# Altium footprint library LukaLIBRARY.PcbLib: 784 footprints (part 40 of 49)
Each footprint in its own frame and in the unit in brackets; x right, y up, seen from the top. Pads: shape width x height; smd on the part's side, far side on the other; paste and mask are expansions set on the pad; w line width, h text height; cw(c..) or ccw(c..) is an arc to the next point about the centre after c.
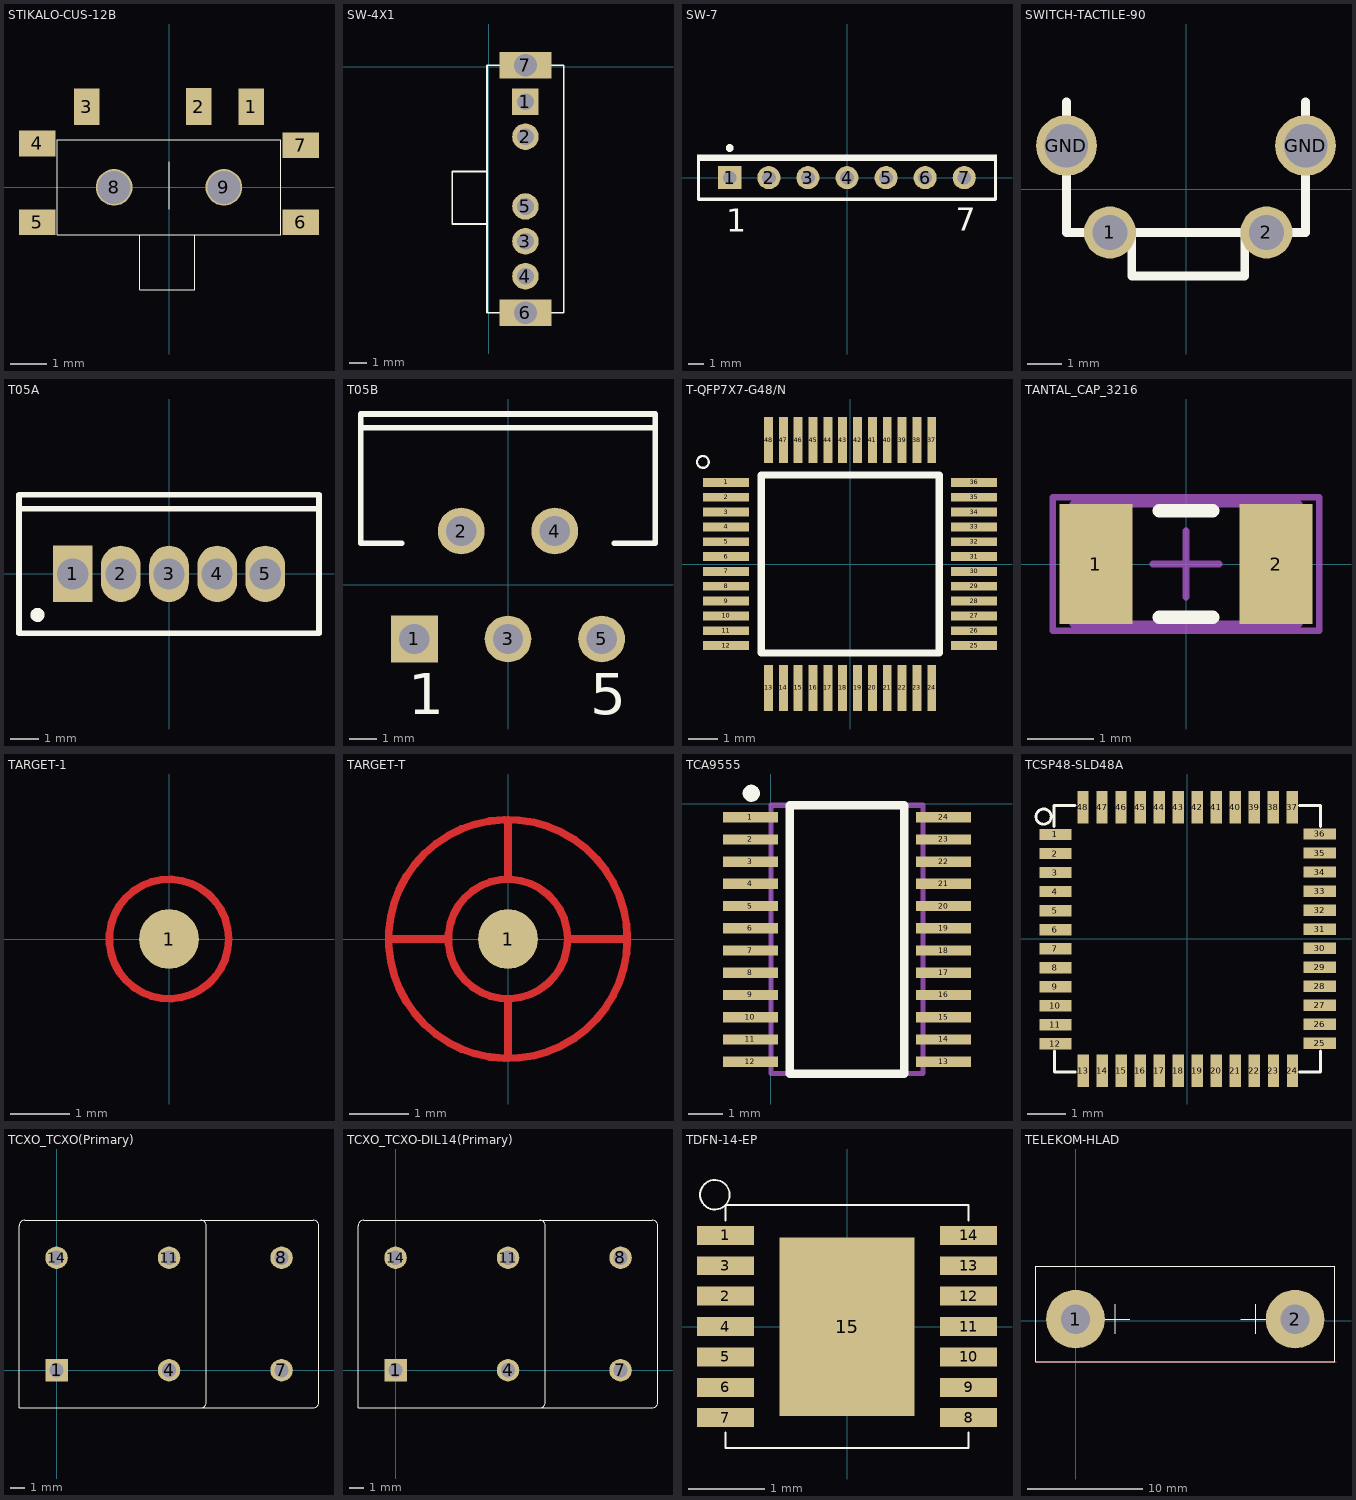
[diagram p39: the footprints below, top view; thin cyan lines are the x and y axes]

## STIKALO-CUS-12B [mm]
pads (9):
  rect 0.7x1 smd: 1(2.25,2.2) 2(0.813,2.21) 3(-2.25,2.2)
  rect 1x0.7 smd: 4(-3.6,1.2) 5(-3.6,-0.95) 6(3.6,-0.95) 7(3.6,1.15)
  round 1 hole 0.9 unplated: 8(-1.5,0) 9(1.5,0)
Top Overlay:
  lines w0.03: -0.15,-1.3 3.05,-1.3 3.05,1.3 -3.05,1.3 -3.05,-1.3 0,-1.3 ; 0,-0.6 0,0.7 ; -0.8,-2.8 0.7,-2.8 0.7,-1.3 -0.8,-1.3 -0.8,-2.8

## SW-4X1 [mm]
pads (7):
  rect 1.524x1.524 hole 0.965 mask-25.4: 1(2.1,-2)
  round 1.524 hole 0.965 mask-25.4: 2(2.1,-4) 3(2.1,-10) 4(2.1,-12) 5(2.1,-8)
  rect 3x1.524 hole 1.3 mask-25.4: 6(2.1,-14.1) 7(2.1,0.1)
Top Overlay:
  lines w0.1: -0.1,-9 -2.1,-9 -2.1,-6 -0.1,-6 ; 1.3,-14.1 -0.1,-14.1 -0.1,0.1 1.3,0.1 ; 2.9,-14.1 4.3,-14.1 4.3,0.1 2.9,0.1
Top Solder:
  region: 2.1,-9.231 1.901,-9.258 1.716,-9.334 1.557,-9.457 1.434,-9.616 1.358,-9.801 1.331,-10 1.358,-10.199 1.434,-10.384 1.557,-10.543 1.716,-10.666 1.901,-10.742 2.1,-10.769 2.299,-10.742 2.484,-10.666 2.643,-10.543 2.766,-10.384 2.842,-10.199 2.869,-10 2.842,-9.801 2.766,-9.616 2.643,-9.457 2.484,-9.334 2.299,-9.258
  region: 2.1,-11.231 1.901,-11.258 1.716,-11.334 1.557,-11.457 1.434,-11.616 1.358,-11.801 1.331,-12 1.358,-12.199 1.434,-12.384 1.557,-12.543 1.716,-12.666 1.901,-12.742 2.1,-12.769 2.299,-12.742 2.484,-12.666 2.643,-12.543 2.766,-12.384 2.842,-12.199 2.869,-12 2.842,-11.801 2.766,-11.616 2.643,-11.457 2.484,-11.334 2.299,-11.258
  region: 2.1,-7.231 1.901,-7.258 1.716,-7.334 1.557,-7.457 1.434,-7.616 1.358,-7.801 1.331,-8 1.358,-8.199 1.434,-8.384 1.557,-8.543 1.716,-8.666 1.901,-8.742 2.1,-8.769 2.299,-8.742 2.484,-8.666 2.643,-8.543 2.766,-8.384 2.842,-8.199 2.869,-8 2.842,-7.801 2.766,-7.616 2.643,-7.457 2.484,-7.334 2.299,-7.258
  region: 2.1,-3.231 1.901,-3.258 1.716,-3.334 1.557,-3.457 1.434,-3.616 1.358,-3.801 1.331,-4 1.358,-4.199 1.434,-4.384 1.557,-4.543 1.716,-4.666 1.901,-4.742 2.1,-4.769 2.299,-4.742 2.484,-4.666 2.643,-4.543 2.766,-4.384 2.842,-4.199 2.869,-4 2.842,-3.801 2.766,-3.616 2.643,-3.457 2.484,-3.334 2.299,-3.258
  region: 1.338,-2.762 2.862,-2.762 2.862,-1.238 1.338,-1.238
  region: 3.6,-0.662 3.6,0.862 0.6,0.862 0.6,-0.662
  region: 3.6,-14.862 3.6,-13.338 0.6,-13.338 0.6,-14.862
Bottom Solder:
  region: 2.1,-9.231 1.901,-9.258 1.716,-9.334 1.557,-9.457 1.434,-9.616 1.358,-9.801 1.331,-10 1.358,-10.199 1.434,-10.384 1.557,-10.543 1.716,-10.666 1.901,-10.742 2.1,-10.769 2.299,-10.742 2.484,-10.666 2.643,-10.543 2.766,-10.384 2.842,-10.199 2.869,-10 2.842,-9.801 2.766,-9.616 2.643,-9.457 2.484,-9.334 2.299,-9.258
  region: 2.1,-11.231 1.901,-11.258 1.716,-11.334 1.557,-11.457 1.434,-11.616 1.358,-11.801 1.331,-12 1.358,-12.199 1.434,-12.384 1.557,-12.543 1.716,-12.666 1.901,-12.742 2.1,-12.769 2.299,-12.742 2.484,-12.666 2.643,-12.543 2.766,-12.384 2.842,-12.199 2.869,-12 2.842,-11.801 2.766,-11.616 2.643,-11.457 2.484,-11.334 2.299,-11.258
  region: 2.1,-7.231 1.901,-7.258 1.716,-7.334 1.557,-7.457 1.434,-7.616 1.358,-7.801 1.331,-8 1.358,-8.199 1.434,-8.384 1.557,-8.543 1.716,-8.666 1.901,-8.742 2.1,-8.769 2.299,-8.742 2.484,-8.666 2.643,-8.543 2.766,-8.384 2.842,-8.199 2.869,-8 2.842,-7.801 2.766,-7.616 2.643,-7.457 2.484,-7.334 2.299,-7.258
  region: 2.1,-3.231 1.901,-3.258 1.716,-3.334 1.557,-3.457 1.434,-3.616 1.358,-3.801 1.331,-4 1.358,-4.199 1.434,-4.384 1.557,-4.543 1.716,-4.666 1.901,-4.742 2.1,-4.769 2.299,-4.742 2.484,-4.666 2.643,-4.543 2.766,-4.384 2.842,-4.199 2.869,-4 2.842,-3.801 2.766,-3.616 2.643,-3.457 2.484,-3.334 2.299,-3.258
  region: 1.338,-2.762 2.862,-2.762 2.862,-1.238 1.338,-1.238
  region: 3.6,-0.662 3.6,0.862 0.6,0.862 0.6,-0.662
  region: 3.6,-14.862 3.6,-13.338 0.6,-13.338 0.6,-14.862

## SW-7 [mm] "Switch; 7 Leads"
pads (7):
  rect 1.5x1.5 hole 0.9: 1(-7.62,0)
  round 1.5 hole 0.9: 2(-5.08,0) 3(-2.54,0) 4(0,0) 5(2.54,0) 6(5.08,0) 7(7.62,0)
Top Overlay:
  circle w0.25: c-7.625,1.929 r0.125
  rectangle: -9.75,1.1 9.75,1.5
  lines w0.2: -9.65,1.4 -9.65,-1.4 9.65,-1.4 9.65,1.4
  text "7" at 7.084,-3.445 h1.5
  text "1" at -7.851,-3.526 h1.5

## SWITCH-TACTILE-90 [mil]
pads (4):
  round 60 hole 40: 1(-87.5,-50) 2(92.5,-50)
  round 70 hole 50: GND(-137.5,50) GND(137.5,50)
Top Overlay:
  lines w10: -137.5,100 -137.5,-50 137.5,-50 137.5,100 ; -62.5,-50 -62.5,-100 67.5,-100 67.5,-50

## T05A [mm] "TO, Thru-Hole, Vertical, Heatsink Mounted; 5 In-Line Leads; Pitch 1.70 mm"
height 15.9
pads (5):
  rect 1.4x2 hole 1.1: 1(-3.4,0)
  oval 1.4x2 hole 1.1: 2(-1.7,0) 3(0,0) 4(1.7,0) 5(3.4,0)
Top Overlay:
  circle w0.25: c-4.65,-1.45 r0.125
  lines w0.2: -5.3,2.3 5.3,2.3 ; -5.3,-2.1 -5.3,2.8 5.3,2.8 5.3,-2.1 -5.3,-2.1
Mechanical 13:
  lines w0.1: -5.3,2.3 5.3,2.3 ; -5.3,-2.1 5.3,-2.1 5.3,2.8 -5.3,2.8 -5.3,-2.1 ; -3.91,-0.28 -2.89,-0.28 -2.89,0.28 -3.91,0.28 -3.91,-0.28 ; -2.21,-0.28 -1.19,-0.28 -1.19,0.28 -2.21,0.28 -2.21,-0.28 ; -0.51,-0.28 0.51,-0.28 0.51,0.28 -0.51,0.28 -0.51,-0.28 ; 1.19,-0.28 2.21,-0.28 2.21,0.28 1.19,0.28 1.19,-0.28 ; 2.89,-0.28 3.91,-0.28 3.91,0.28 2.89,0.28 2.89,-0.28
Mechanical 15:
  lines w0.1: -0.5,0 0.5,0 ; 0,-0.5 0,0.5
3D body: height 4.1, standoff 0, extent -3.909,-0.279 -2.891,0.279
3D body: height 4.1, standoff 0, extent -2.209,-0.279 -1.191,0.279
3D body: height 4.1, standoff 0, extent 1.191,-0.279 2.209,0.279
3D body: height 4.1, standoff 0, extent 2.891,-0.279 3.909,0.279
3D body: height 4.1, standoff 0, extent -0.509,-0.279 0.509,0.279
3D body: height 15.9, standoff 13, extent -5.299,2.301 5.299,2.799
3D body: height 13, standoff 4.1, extent -5.35,-2.15 5.35,2.85

## T05B [mm] "TO, Thru-Hole, Vertical, Heatsink Mounted; 5 Bent Staggered Leads; Pitch 1.7 mm"
height 21.1
pads (5):
  rect 1.7x1.7 hole 1.1: 1(-3.4,-1.96)
  round 1.7 hole 1.1: 2(-1.7,1.96) 3(0,-1.96) 4(1.7,1.96) 5(3.4,-1.96)
Top Overlay:
  lines w0.2: -5.35,5.71 5.35,5.71 ; -3.854,1.51 -5.35,1.51 -5.35,6.21 5.35,6.21 5.35,1.51 3.854,1.51
  text "5" at 2.98,-4.685 h1.5
  text "1" at -3.62,-4.685 h1.5

## T-QFP7X7-G48/N [mm]
pads (48):
  rect 1.55x0.3 smd: 1(-4.175,2.75) 2(-4.175,2.25) 3(-4.175,1.75) 4(-4.175,1.25) 5(-4.175,0.75) 6(-4.175,0.25) 7(-4.175,-0.25) 8(-4.175,-0.75) 9(-4.175,-1.25) 10(-4.175,-1.75) 11(-4.175,-2.25) 12(-4.175,-2.75) 25(4.175,-2.75) 26(4.175,-2.25) 27(4.175,-1.75) 28(4.175,-1.25) 29(4.175,-0.75) 30(4.175,-0.25) 31(4.175,0.25) 32(4.175,0.75) 33(4.175,1.25) 34(4.175,1.75) 35(4.175,2.25) 36(4.175,2.75)
  rect 0.3x1.55 smd: 13(-2.75,-4.175) 14(-2.25,-4.175) 15(-1.75,-4.175) 16(-1.25,-4.175) 17(-0.75,-4.175) 18(-0.25,-4.175) 19(0.25,-4.175) 20(0.75,-4.175) 21(1.25,-4.175) 22(1.75,-4.175) 23(2.25,-4.175) 24(2.75,-4.175) 37(2.75,4.175) 38(2.25,4.175) 39(1.75,4.175) 40(1.25,4.175) 41(0.75,4.175) 42(0.25,4.175) 43(-0.25,4.175) 44(-0.75,4.175) 45(-1.25,4.175) 46(-1.75,4.175) 47(-2.25,4.175) 48(-2.75,4.175)
Top Overlay:
  circle w0.076: c-4.96,3.44 r0.2
  lines w0.25: -3,-3 -3,3 3,3 3,-3 -3,-3

## TANTAL_CAP_3216 [mm] "Tantal Capacitor, Body 3.2x1.6mm, IPC High Density"
height 1.6
pads (2):
  rect 1.1x1.8 smd: 1(-1.35,0) 2(1.35,0)
Top Overlay:
  lines w0.2: -0.4,-0.8 0.4,-0.8 ; -0.4,0.8 0.4,0.8
Mechanical 13:
  lines w0.1: -1.7,-0.9 -1.7,0.9 1.7,0.9 1.7,-0.9 -1.7,-0.9
Mechanical 15:
  lines w0.1: -0.5,0 0.5,0 ; 0,-0.5 0,0.5 ; -2,-1 -2,1 2,1 2,-1 -2,-1
3D body: height 0.55, standoff 0, extent -1.7,-0.9 1.7,0.9

## TARGET-1 [mm]
pads (1):
  round 1 smd mask-25.4: 1(0,0)
Top Layer:
  circle w0.127: c0,0 r1
Top Solder:
  region: 0,2.512 -0.49,2.464 -0.961,2.321 -1.396,2.089 -1.776,1.776 -2.089,1.396 -2.321,0.961 -2.464,0.49 -2.512,0 -2.464,-0.49 -2.321,-0.961 -2.089,-1.396 -1.776,-1.776 -1.396,-2.089 -0.961,-2.321 -0.49,-2.464 0,-2.512 0.49,-2.464 0.961,-2.321 1.396,-2.089 1.776,-1.776 2.089,-1.396 2.321,-0.961 2.464,-0.49 2.512,0 2.464,0.49 2.321,0.961 2.089,1.396 1.776,1.776 1.396,2.089 0.961,2.321 0.49,2.464

## TARGET-T [mm]
pads (1):
  round 1 smd mask-25.4: 1(0,0)
Top Layer:
  circle w0.127: c0,0 r1
  circle w0.127: c0,0 r2
  lines w0.127: -2,0 -1,0 ; 0,-2 0,-1 ; 0,1 0,2 ; 1,0 2,0
Top Solder:
  region: 0,2.512 -0.49,2.464 -0.961,2.321 -1.396,2.089 -1.776,1.776 -2.089,1.396 -2.321,0.961 -2.464,0.49 -2.512,0 -2.464,-0.49 -2.321,-0.961 -2.089,-1.396 -1.776,-1.776 -1.396,-2.089 -0.961,-2.321 -0.49,-2.464 0,-2.512 0.49,-2.464 0.961,-2.321 1.396,-2.089 1.776,-1.776 2.089,-1.396 2.321,-0.961 2.464,-0.49 2.512,0 2.464,0.49 2.321,0.961 2.089,1.396 1.776,1.776 1.396,2.089 0.961,2.321 0.49,2.464

## TCA9555 [mm] "I2C I/O Ports PW Package"
pads (24):
  rect 1.6x0.3 smd: 1(-0.6,-0.4) 2(-0.6,-1.05) 3(-0.6,-1.7) 4(-0.6,-2.35) 5(-0.6,-3) 6(-0.6,-3.65) 7(-0.6,-4.3) 8(-0.6,-4.95) 9(-0.6,-5.6) 10(-0.6,-6.25) 11(-0.6,-6.9) 12(-0.6,-7.55) 13(5.05,-7.55) 14(5.05,-6.9) 15(5.05,-6.25) 16(5.05,-5.6) 17(5.05,-4.95) 18(5.05,-4.3) 19(5.05,-3.65) 20(5.05,-3) 21(5.05,-2.35) 22(5.05,-1.7) 23(5.05,-1.05) 24(5.05,-0.4)
Top Overlay:
  circle w0.25: c-0.575,0.3 r0.125
  lines w0.254: 0.55,-7.9 0.55,-0.05 3.9,-0.05 3.9,-7.9 0.55,-7.9
Mechanical 1:
  lines w0.15: 0,-7.9 0,-0.05 4.45,-0.05 4.45,-7.9 0,-7.9

## TCSP48-SLD48A [mm]
pads (48):
  rect 0.85x0.3 smd mask-25.4: 1(-3.471,2.742) 2(-3.471,2.242) 3(-3.471,1.742) 4(-3.471,1.242) 5(-3.471,0.742) 6(-3.471,0.242) 7(-3.471,-0.258) 8(-3.471,-0.758) 9(-3.471,-1.258) 10(-3.471,-1.758) 11(-3.471,-2.258) 12(-3.471,-2.758) 25(3.479,-2.745) 26(3.479,-2.245) 27(3.479,-1.745) 28(3.479,-1.245) 29(3.479,-0.745) 30(3.479,-0.245) 31(3.479,0.255) 32(3.479,0.755) 33(3.479,1.255) 34(3.479,1.755) 35(3.479,2.255) 36(3.479,2.755)
  rect 0.3x0.85 smd mask-25.4: 13(-2.74,-3.472) 14(-2.24,-3.472) 15(-1.74,-3.472) 16(-1.24,-3.472) 17(-0.74,-3.472) 18(-0.24,-3.472) 19(0.26,-3.472) 20(0.76,-3.472) 21(1.26,-3.472) 22(1.76,-3.472) 23(2.26,-3.472) 24(2.76,-3.472) 37(2.753,3.461) 38(2.253,3.461) 39(1.753,3.461) 40(1.253,3.461) 41(0.753,3.461) 42(0.253,3.461) 43(-0.247,3.461) 44(-0.747,3.461) 45(-1.247,3.461) 46(-1.747,3.461) 47(-2.247,3.461) 48(-2.747,3.461)
Top Overlay:
  circle w0.076: c-3.782,3.212 r0.2
  lines w0.076: -3.509,2.95 -3.509,3.5 -2.959,3.5 ; -3.5,-3.5 -2.95,-3.5 ; -3.498,-3.499 -3.498,-2.949 ; 2.948,-3.498 3.498,-3.498 ; 2.948,3.501 3.498,3.501 ; 3.5,-3.498 3.5,-2.948 ; 3.5,2.952 3.5,3.502
Top Solder:
  drawing of 48 lines, arcs and shapes, not listed

## TCXO_TCXO(Primary) [mil]
pads (6):
  rect 60x60 hole 38 mask-1000: 1(0,0)
  round 60 hole 38 mask-1000: 4(300,0) 7(600,0) 8(600,300) 11(300,300) 14(0,300)
Top Overlay:
  lines w1: 385,-100 ccw(c385,-85) 400,-85 400,385 ccw(c385,385) 385,400 ; -100,-100 -100,385 cw(c-85,385) -85,400 685,400 cw(c685,385) 700,385 700,-85 cw(c685,-85) 685,-100 -100,-100
Top Solder:
  region: -30,-30 30,-30 30,30 -30,30
  region: 300,30.26 292.17,29.23 284.87,26.2 278.6,21.4 273.8,15.13 270.77,7.83 269.74,0 270.77,-7.83 273.8,-15.13 278.6,-21.4 284.87,-26.2 292.17,-29.23 300,-30.26 307.83,-29.23 315.13,-26.2 321.4,-21.4 326.2,-15.13 329.23,-7.83 330.26,0 329.23,7.83 326.2,15.13 321.4,21.4 315.13,26.2 307.83,29.23
  region: 300,330.26 292.17,329.23 284.87,326.2 278.6,321.4 273.8,315.13 270.77,307.83 269.74,300 270.77,292.17 273.8,284.87 278.6,278.6 284.87,273.8 292.17,270.77 300,269.74 307.83,270.77 315.13,273.8 321.4,278.6 326.2,284.87 329.23,292.17 330.26,300 329.23,307.83 326.2,315.13 321.4,321.4 315.13,326.2 307.83,329.23
  region: 0,330.26 -7.83,329.23 -15.13,326.2 -21.4,321.4 -26.2,315.13 -29.23,307.83 -30.26,300 -29.23,292.17 -26.2,284.87 -21.4,278.6 -15.13,273.8 -7.83,270.77 0,269.74 7.83,270.77 15.13,273.8 21.4,278.6 26.2,284.87 29.23,292.17 30.26,300 29.23,307.83 26.2,315.13 21.4,321.4 15.13,326.2 7.83,329.23
  region: 600,30.26 592.17,29.23 584.87,26.2 578.6,21.4 573.79,15.13 570.77,7.83 569.74,0 570.77,-7.83 573.79,-15.13 578.6,-21.4 584.87,-26.2 592.17,-29.23 600,-30.26 607.83,-29.23 615.13,-26.2 621.4,-21.4 626.21,-15.13 629.23,-7.83 630.26,0 629.23,7.83 626.21,15.13 621.4,21.4 615.13,26.2 607.83,29.23
  region: 600,330.26 592.17,329.23 584.87,326.2 578.6,321.4 573.79,315.13 570.77,307.83 569.74,300 570.77,292.17 573.79,284.87 578.6,278.6 584.87,273.8 592.17,270.77 600,269.74 607.83,270.77 615.13,273.8 621.4,278.6 626.21,284.87 629.23,292.17 630.26,300 629.23,307.83 626.21,315.13 621.4,321.4 615.13,326.2 607.83,329.23
Bottom Solder:
  region: -30,-30 30,-30 30,30 -30,30
  region: 300,30.26 292.17,29.23 284.87,26.2 278.6,21.4 273.8,15.13 270.77,7.83 269.74,0 270.77,-7.83 273.8,-15.13 278.6,-21.4 284.87,-26.2 292.17,-29.23 300,-30.26 307.83,-29.23 315.13,-26.2 321.4,-21.4 326.2,-15.13 329.23,-7.83 330.26,0 329.23,7.83 326.2,15.13 321.4,21.4 315.13,26.2 307.83,29.23
  region: 300,330.26 292.17,329.23 284.87,326.2 278.6,321.4 273.8,315.13 270.77,307.83 269.74,300 270.77,292.17 273.8,284.87 278.6,278.6 284.87,273.8 292.17,270.77 300,269.74 307.83,270.77 315.13,273.8 321.4,278.6 326.2,284.87 329.23,292.17 330.26,300 329.23,307.83 326.2,315.13 321.4,321.4 315.13,326.2 307.83,329.23
  region: 0,330.26 -7.83,329.23 -15.13,326.2 -21.4,321.4 -26.2,315.13 -29.23,307.83 -30.26,300 -29.23,292.17 -26.2,284.87 -21.4,278.6 -15.13,273.8 -7.83,270.77 0,269.74 7.83,270.77 15.13,273.8 21.4,278.6 26.2,284.87 29.23,292.17 30.26,300 29.23,307.83 26.2,315.13 21.4,321.4 15.13,326.2 7.83,329.23
  region: 600,30.26 592.17,29.23 584.87,26.2 578.6,21.4 573.79,15.13 570.77,7.83 569.74,0 570.77,-7.83 573.79,-15.13 578.6,-21.4 584.87,-26.2 592.17,-29.23 600,-30.26 607.83,-29.23 615.13,-26.2 621.4,-21.4 626.21,-15.13 629.23,-7.83 630.26,0 629.23,7.83 626.21,15.13 621.4,21.4 615.13,26.2 607.83,29.23
  region: 600,330.26 592.17,329.23 584.87,326.2 578.6,321.4 573.79,315.13 570.77,307.83 569.74,300 570.77,292.17 573.79,284.87 578.6,278.6 584.87,273.8 592.17,270.77 600,269.74 607.83,270.77 615.13,273.8 621.4,278.6 626.21,284.87 629.23,292.17 630.26,300 629.23,307.83 626.21,315.13 621.4,321.4 615.13,326.2 607.83,329.23

## TCXO_TCXO-DIL14(Primary) [mil]
pads (6):
  rect 60x60 hole 38 mask-1000: 1(0,0)
  round 60 hole 38 mask-1000: 4(300,0) 7(600,0) 8(600,300) 11(300,300) 14(0,300)
Top Overlay:
  lines w1: 385,-100 ccw(c385,-85) 400,-85 400,385 ccw(c385,385) 385,400 ; -100,-100 685,-100 ccw(c685,-85) 700,-85 700,385 ccw(c685,385) 685,400 -85,400 ccw(c-85,385) -100,385 -100,-100
Top Solder:
  region: 600,330.26 592.17,329.23 584.87,326.2 578.6,321.4 573.79,315.13 570.77,307.83 569.74,300 570.77,292.17 573.79,284.87 578.6,278.6 584.87,273.8 592.17,270.77 600,269.74 607.83,270.77 615.13,273.8 621.4,278.6 626.21,284.87 629.23,292.17 630.26,300 629.23,307.83 626.21,315.13 621.4,321.4 615.13,326.2 607.83,329.23
  region: 600,30.26 592.17,29.23 584.87,26.2 578.6,21.4 573.79,15.13 570.77,7.83 569.74,0 570.77,-7.83 573.79,-15.13 578.6,-21.4 584.87,-26.2 592.17,-29.23 600,-30.26 607.83,-29.23 615.13,-26.2 621.4,-21.4 626.21,-15.13 629.23,-7.83 630.26,0 629.23,7.83 626.21,15.13 621.4,21.4 615.13,26.2 607.83,29.23
  region: 0,330.26 -7.83,329.23 -15.13,326.2 -21.4,321.4 -26.2,315.13 -29.23,307.83 -30.26,300 -29.23,292.17 -26.2,284.87 -21.4,278.6 -15.13,273.8 -7.83,270.77 0,269.74 7.83,270.77 15.13,273.8 21.4,278.6 26.2,284.87 29.23,292.17 30.26,300 29.23,307.83 26.2,315.13 21.4,321.4 15.13,326.2 7.83,329.23
  region: 300,330.26 292.17,329.23 284.87,326.2 278.6,321.4 273.8,315.13 270.77,307.83 269.74,300 270.77,292.17 273.8,284.87 278.6,278.6 284.87,273.8 292.17,270.77 300,269.74 307.83,270.77 315.13,273.8 321.4,278.6 326.2,284.87 329.23,292.17 330.26,300 329.23,307.83 326.2,315.13 321.4,321.4 315.13,326.2 307.83,329.23
  region: 300,30.26 292.17,29.23 284.87,26.2 278.6,21.4 273.8,15.13 270.77,7.83 269.74,0 270.77,-7.83 273.8,-15.13 278.6,-21.4 284.87,-26.2 292.17,-29.23 300,-30.26 307.83,-29.23 315.13,-26.2 321.4,-21.4 326.2,-15.13 329.23,-7.83 330.26,0 329.23,7.83 326.2,15.13 321.4,21.4 315.13,26.2 307.83,29.23
  region: -30,-30 30,-30 30,30 -30,30
Bottom Solder:
  region: 600,330.26 592.17,329.23 584.87,326.2 578.6,321.4 573.79,315.13 570.77,307.83 569.74,300 570.77,292.17 573.79,284.87 578.6,278.6 584.87,273.8 592.17,270.77 600,269.74 607.83,270.77 615.13,273.8 621.4,278.6 626.21,284.87 629.23,292.17 630.26,300 629.23,307.83 626.21,315.13 621.4,321.4 615.13,326.2 607.83,329.23
  region: 600,30.26 592.17,29.23 584.87,26.2 578.6,21.4 573.79,15.13 570.77,7.83 569.74,0 570.77,-7.83 573.79,-15.13 578.6,-21.4 584.87,-26.2 592.17,-29.23 600,-30.26 607.83,-29.23 615.13,-26.2 621.4,-21.4 626.21,-15.13 629.23,-7.83 630.26,0 629.23,7.83 626.21,15.13 621.4,21.4 615.13,26.2 607.83,29.23
  region: 0,330.26 -7.83,329.23 -15.13,326.2 -21.4,321.4 -26.2,315.13 -29.23,307.83 -30.26,300 -29.23,292.17 -26.2,284.87 -21.4,278.6 -15.13,273.8 -7.83,270.77 0,269.74 7.83,270.77 15.13,273.8 21.4,278.6 26.2,284.87 29.23,292.17 30.26,300 29.23,307.83 26.2,315.13 21.4,321.4 15.13,326.2 7.83,329.23
  region: 300,330.26 292.17,329.23 284.87,326.2 278.6,321.4 273.8,315.13 270.77,307.83 269.74,300 270.77,292.17 273.8,284.87 278.6,278.6 284.87,273.8 292.17,270.77 300,269.74 307.83,270.77 315.13,273.8 321.4,278.6 326.2,284.87 329.23,292.17 330.26,300 329.23,307.83 326.2,315.13 321.4,321.4 315.13,326.2 307.83,329.23
  region: 300,30.26 292.17,29.23 284.87,26.2 278.6,21.4 273.8,15.13 270.77,7.83 269.74,0 270.77,-7.83 273.8,-15.13 278.6,-21.4 284.87,-26.2 292.17,-29.23 300,-30.26 307.83,-29.23 315.13,-26.2 321.4,-21.4 326.2,-15.13 329.23,-7.83 330.26,0 329.23,7.83 326.2,15.13 321.4,21.4 315.13,26.2 307.83,29.23
  region: -30,-30 30,-30 30,30 -30,30

## TDFN-14-EP [mm]
pads (15):
  rect 0.75x0.25 smd mask-25.4: 1(-1.6,1.2) 2(-1.6,0.4) 3(-1.6,0.8) 4(-1.6,0) 5(-1.6,-0.4) 6(-1.6,-0.8) 7(-1.6,-1.2) 8(1.6,-1.2) 9(1.6,-0.8) 10(1.6,-0.4) 11(1.6,0) 12(1.6,0.4) 13(1.6,0.8) 14(1.6,1.2)
  rect 1.78x2.35 smd mask-25.4: 15(0,0)
Top Overlay:
  circle w0.025: c-1.74,1.735 r0.194
  lines w0.03: -1.6,-1.4 -1.6,-1.6 1.6,-1.6 1.6,-1.4 ; -1.6,1.4 -1.6,1.6 1.6,1.6 1.6,1.4
Top Solder:
  region: -0.89,-1.175 0.89,-1.175 0.89,1.175 -0.89,1.175
  region: 1.975,-0.1 1.975,0.1 1.225,0.1 1.225,-0.1
  region: -1.225,-0.1 -1.225,0.1 -1.975,0.1 -1.975,-0.1
  region: 1.975,1.1 1.975,1.3 1.225,1.3 1.225,1.1
  region: 1.975,0.7 1.975,0.9 1.225,0.9 1.225,0.7
  region: 1.975,0.3 1.975,0.5 1.225,0.5 1.225,0.3
  region: -1.225,1.1 -1.225,1.3 -1.975,1.3 -1.975,1.1
  region: -1.225,0.7 -1.225,0.9 -1.975,0.9 -1.975,0.7
  region: -1.225,0.3 -1.225,0.5 -1.975,0.5 -1.975,0.3
  region: 1.975,-0.5 1.975,-0.3 1.225,-0.3 1.225,-0.5
  region: 1.975,-0.9 1.975,-0.7 1.225,-0.7 1.225,-0.9
  region: 1.975,-1.3 1.975,-1.1 1.225,-1.1 1.225,-1.3
  region: -1.225,-1.3 -1.225,-1.1 -1.975,-1.1 -1.975,-1.3
  region: -1.975,-0.7 -1.975,-0.9 -1.225,-0.9 -1.225,-0.7
  region: -1.225,-0.5 -1.225,-0.3 -1.975,-0.3 -1.975,-0.5

## TELEKOM-HLAD [mil]
pads (2):
  round 200 hole 100: 1(0,5) 2(750,5)
Top Layer:
  lines w0.39: -135,185 -135,-140 890,-140 ; 885,-140 885,180
Top Overlay:
  lines w3.94: -135,170 -135,185 885,185 885,-140 340,-140 -135,-140 -135,180 ; -50,5 55,5 ; 0,-45 0,55 ; 85,5 185,5 ; 135,-45 135,55 ; 565,5 670,5 ; 615,-45 615,55 ; 700,5 800,5 ; 750,-45 750,55